# Altium footprint library 15EDGVC_VH.PcbLib: 46 footprints (part 2 of 3)
Each footprint in its own frame and in the unit in brackets; x right, y up, seen from the top. Pads: shape width x height; smd on the part's side, far side on the other; paste and mask are expansions set on the pad; w line width, h text height; cw(c..) or ccw(c..) is an arc to the next point about the centre after c.
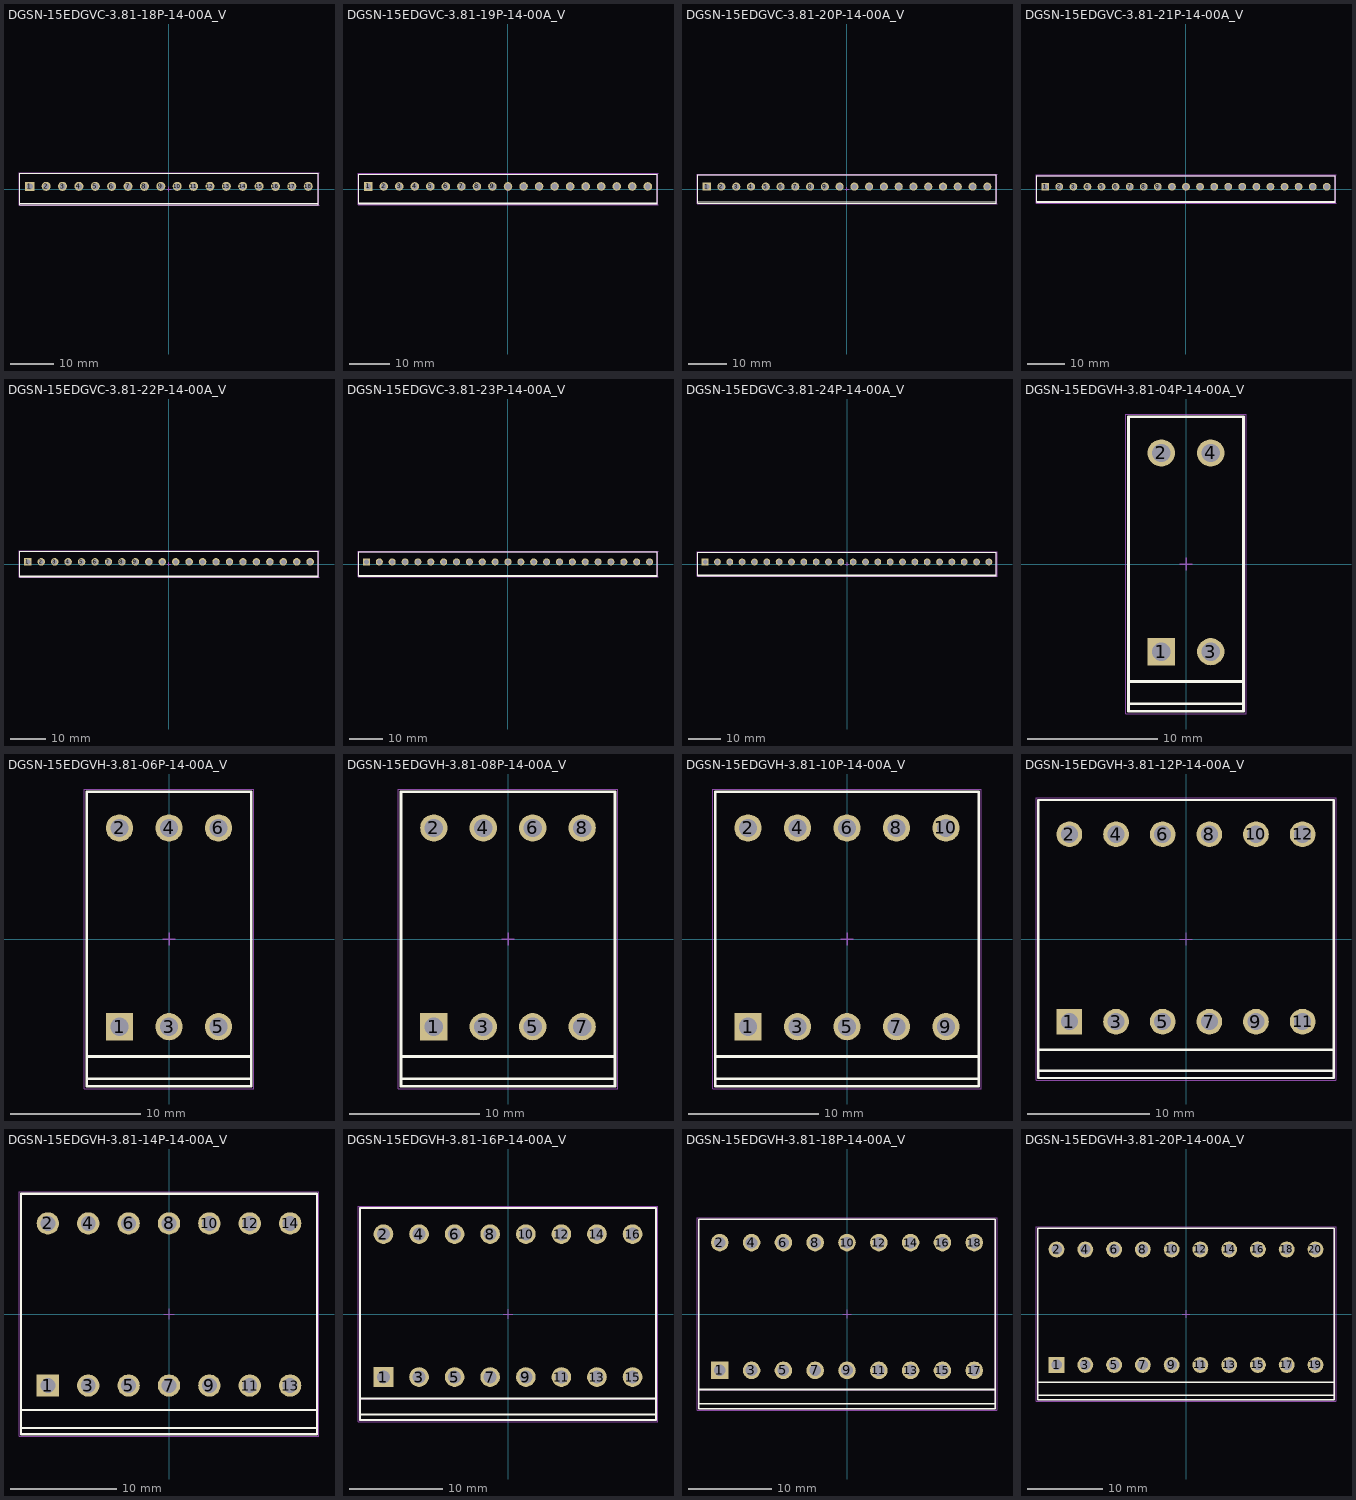
[diagram p1: the footprints below, top view; thin cyan lines are the x and y axes]

## DGSN-15EDGVC-3.81-18P-14-00A_V [mm] "Terminal Block, 18-Pin, Body 69.37x7.24mm, Pitch 3.81mm"
height 9.2
pads (18):
  rect 2.1x2.1 hole 1.4: 1(-32.385,0.62)
  round 2.1 hole 1.4: 2(-28.575,0.62) 3(-24.765,0.62) 4(-20.955,0.62) 5(-17.145,0.62) 6(-13.335,0.62) 7(-9.525,0.62) 8(-5.715,0.62) 9(-1.905,0.62) 10(1.905,0.62) 11(5.715,0.62) 12(9.525,0.62) 13(13.335,0.62) 14(17.145,0.62) 15(20.955,0.62) 16(24.765,0.62) 17(28.575,0.62) 18(32.385,0.62)
Top Overlay:
  lines w0.2: -34.685,-3.35 34.685,-3.35 ; -34.685,-3.62 34.685,-3.62 34.685,3.62 -34.685,3.62 -34.685,-3.62
Mechanical 13:
  lines w0.1: -34.685,-3.62 34.685,-3.62 34.685,3.62 -34.685,3.62 -34.685,-3.62
Mechanical 15:
  lines w0.05: -34.885,-3.82 -34.885,3.82 ; -34.885,-3.82 34.885,-3.82 34.885,3.82 -34.885,3.82
  lines w0.1: -0.5,0 0.5,0 ; 0,-0.5 0,0.5
3D body "15EDGVC-3.81-18P-14-00AH.STEP": height 9.2, standoff -3.4, extent -34.685,-3.58 34.685,3.62

## DGSN-15EDGVC-3.81-19P-14-00A_V [mm] "Terminal Block, 19-Pin, Body 73.18x7.24mm, Pitch 3.81mm"
height 9.2
pads (19):
  rect 2.1x2.1 hole 1.4: 1(-34.29,0.62)
  round 2.1 hole 1.4: 2(-30.48,0.62) 3(-26.67,0.62) 4(-22.86,0.62) 5(-19.05,0.62) 6(-15.24,0.62) 7(-11.43,0.62) 8(-7.62,0.62) 9(-3.81,0.62) 10(0,0.62) 11(3.81,0.62) 12(7.62,0.62) 13(11.43,0.62) 14(15.24,0.62) 15(19.05,0.62) 16(22.86,0.62) 17(26.67,0.62) 18(30.48,0.62) 19(34.29,0.62)
Top Overlay:
  lines w0.2: -36.59,-3.35 36.59,-3.35 ; -36.59,-3.62 36.59,-3.62 36.59,3.62 -36.59,3.62 -36.59,-3.62
Mechanical 13:
  lines w0.1: -36.59,-3.62 36.59,-3.62 36.59,3.62 -36.59,3.62 -36.59,-3.62
Mechanical 15:
  lines w0.05: -36.79,-3.82 -36.79,3.82 ; -36.79,-3.82 36.79,-3.82 36.79,3.82 -36.79,3.82
  lines w0.1: -0.5,0 0.5,0 ; 0,-0.5 0,0.5
3D body "15EDGVC-3.81-19P-14-00AH.STEP": height 9.2, standoff -3.4, extent -36.59,-3.58 36.59,3.62

## DGSN-15EDGVC-3.81-20P-14-00A_V [mm] "Terminal Block, 20-Pin, Body 76.99x7.24mm, Pitch 3.81mm"
height 9.2
pads (20):
  rect 2.1x2.1 hole 1.4: 1(-36.195,0.62)
  round 2.1 hole 1.4: 2(-32.385,0.62) 3(-28.575,0.62) 4(-24.765,0.62) 5(-20.955,0.62) 6(-17.145,0.62) 7(-13.335,0.62) 8(-9.525,0.62) 9(-5.715,0.62) 10(-1.905,0.62) 11(1.905,0.62) 12(5.715,0.62) 13(9.525,0.62) 14(13.335,0.62) 15(17.145,0.62) 16(20.955,0.62) 17(24.765,0.62) 18(28.575,0.62) 19(32.385,0.62) 20(36.195,0.62)
Top Overlay:
  lines w0.2: -38.495,-3.35 38.495,-3.35 ; -38.495,-3.62 38.495,-3.62 38.495,3.62 -38.495,3.62 -38.495,-3.62
Mechanical 13:
  lines w0.1: -38.495,-3.62 38.495,-3.62 38.495,3.62 -38.495,3.62 -38.495,-3.62
Mechanical 15:
  lines w0.05: -38.695,-3.82 -38.695,3.82 ; -38.695,-3.82 38.695,-3.82 38.695,3.82 -38.695,3.82
  lines w0.1: -0.5,0 0.5,0 ; 0,-0.5 0,0.5
3D body "15EDGVC-3.81-20P-14-00AH.STEP": height 9.2, standoff -3.4, extent -38.495,-3.58 38.495,3.62

## DGSN-15EDGVC-3.81-21P-14-00A_V [mm] "Terminal Block, 21-Pin, Body 80.80x7.24mm, Pitch 3.81mm"
height 9.2
pads (21):
  rect 2.1x2.1 hole 1.4: 1(-38.1,0.62)
  round 2.1 hole 1.4: 2(-34.29,0.62) 3(-30.48,0.62) 4(-26.67,0.62) 5(-22.86,0.62) 6(-19.05,0.62) 7(-15.24,0.62) 8(-11.43,0.62) 9(-7.62,0.62) 10(-3.81,0.62) 11(0,0.62) 12(3.81,0.62) 13(7.62,0.62) 14(11.43,0.62) 15(15.24,0.62) 16(19.05,0.62) 17(22.86,0.62) 18(26.67,0.62) 19(30.48,0.62) 20(34.29,0.62) 21(38.1,0.62)
Top Overlay:
  lines w0.2: -40.4,-3.35 40.4,-3.35 ; -40.4,-3.62 40.4,-3.62 40.4,3.62 -40.4,3.62 -40.4,-3.62
Mechanical 13:
  lines w0.1: -40.4,-3.62 40.4,-3.62 40.4,3.62 -40.4,3.62 -40.4,-3.62
Mechanical 15:
  lines w0.05: -40.6,-3.82 -40.6,3.82 ; -40.6,-3.82 40.6,-3.82 40.6,3.82 -40.6,3.82
  lines w0.1: -0.5,0 0.5,0 ; 0,-0.5 0,0.5
3D body "15EDGVC-3.81-21P-14-00AH.STEP": height 9.2, standoff -3.4, extent -40.4,-3.58 40.4,3.62

## DGSN-15EDGVC-3.81-22P-14-00A_V [mm] "Terminal Block, 22-Pin, Body 84.61x7.24mm, Pitch 3.81mm"
height 9.2
pads (22):
  rect 2.1x2.1 hole 1.4: 1(-40.005,0.62)
  round 2.1 hole 1.4: 2(-36.195,0.62) 3(-32.385,0.62) 4(-28.575,0.62) 5(-24.765,0.62) 6(-20.955,0.62) 7(-17.145,0.62) 8(-13.335,0.62) 9(-9.525,0.62) 10(-5.715,0.62) 11(-1.905,0.62) 12(1.905,0.62) 13(5.715,0.62) 14(9.525,0.62) 15(13.335,0.62) 16(17.145,0.62) 17(20.955,0.62) 18(24.765,0.62) 19(28.575,0.62) 20(32.385,0.62) 21(36.195,0.62) 22(40.005,0.62)
Top Overlay:
  lines w0.2: -42.305,-3.35 42.305,-3.35 ; -42.305,-3.62 -42.305,3.62 42.305,3.62 42.305,-3.62 -42.305,-3.62
Mechanical 13:
  lines w0.1: -42.305,-3.62 -42.305,3.62 42.305,3.62 42.305,-3.62 -42.305,-3.62
Mechanical 15:
  lines w0.05: -42.505,-3.82 -42.505,3.82 ; -42.505,-3.82 42.505,-3.82 42.505,3.82 -42.505,3.82
  lines w0.1: -0.5,0 0.5,0 ; 0,-0.5 0,0.5
3D body "15EDGVC-3.81-22P-14-00AH.STEP": height 9.2, standoff -3.4, extent -42.305,-3.58 42.305,3.62

## DGSN-15EDGVC-3.81-23P-14-00A_V [mm] "Terminal Block, 23-Pin, Body 88.42x7.24mm, Pitch 3.81mm"
height 9.2
pads (23):
  rect 2.1x2.1 hole 1.4: 1(-41.91,0.62)
  round 2.1 hole 1.4: 2(-38.1,0.62) 3(-34.29,0.62) 4(-30.48,0.62) 5(-26.67,0.62) 6(-22.86,0.62) 7(-19.05,0.62) 8(-15.24,0.62) 9(-11.43,0.62) 10(-7.62,0.62) 11(-3.81,0.62) 12(0,0.62) 13(3.81,0.62) 14(7.62,0.62) 15(11.43,0.62) 16(15.24,0.62) 17(19.05,0.62) 18(22.86,0.62) 19(26.67,0.62) 20(30.48,0.62) 21(34.29,0.62) 22(38.1,0.62) 23(41.91,0.62)
Top Overlay:
  lines w0.2: -44.21,-3.35 44.21,-3.35 ; -44.21,-3.62 44.21,-3.62 44.21,3.62 -44.21,3.62 -44.21,-3.62
Mechanical 13:
  lines w0.1: -44.21,-3.62 44.21,-3.62 44.21,3.62 -44.21,3.62 -44.21,-3.62
Mechanical 15:
  lines w0.05: -44.41,-3.82 -44.41,3.82 ; -44.41,-3.82 44.41,-3.82 44.41,3.82 -44.41,3.82
  lines w0.1: -0.5,0 0.5,0 ; 0,-0.5 0,0.5
3D body "15EDGVC-3.81-23P-14-00AH.STEP": height 9.2, standoff -3.4, extent -44.21,-3.58 44.21,3.62

## DGSN-15EDGVC-3.81-24P-14-00A_V [mm] "Terminal Block, 24-Pin, Body 92.23x7.24mm, Pitch 3.81mm"
height 9.2
pads (24):
  rect 2.1x2.1 hole 1.4: 1(-43.815,0.62)
  round 2.1 hole 1.4: 2(-40.005,0.62) 3(-36.195,0.62) 4(-32.385,0.62) 5(-28.575,0.62) 6(-24.765,0.62) 7(-20.955,0.62) 8(-17.145,0.62) 9(-13.335,0.62) 10(-9.525,0.62) 11(-5.715,0.62) 12(-1.905,0.62) 13(1.905,0.62) 14(5.715,0.62) 15(9.525,0.62) 16(13.335,0.62) 17(17.145,0.62) 18(20.955,0.62) 19(24.765,0.62) 20(28.575,0.62) 21(32.385,0.62) 22(36.195,0.62) 23(40.005,0.62) 24(43.815,0.62)
Top Overlay:
  lines w0.2: -46.115,-3.35 46.115,-3.35 ; -46.115,-3.62 -46.115,3.62 46.115,3.62 46.115,-3.62 -46.115,-3.62
Mechanical 13:
  lines w0.1: -46.115,-3.62 -46.115,3.62 46.115,3.62 46.115,-3.62 -46.115,-3.62
Mechanical 15:
  lines w0.05: -46.315,-3.82 -46.315,3.82 ; -46.315,-3.82 46.315,-3.82 46.315,3.82 -46.315,3.82
  lines w0.1: -0.5,0 0.5,0 ; 0,-0.5 0,0.5
3D body "15EDGVC-3.81-24P-14-00AH.STEP": height 9.2, standoff -3.4, extent -46.115,-3.58 46.115,3.62

## DGSN-15EDGVH-3.81-04P-14-00A_V [mm] "Terminal Block, 4-Pin, Body 8.86x22.70mm, Pitch 3.81mm"
height 21.8
pads (4):
  rect 2.1x2.1 hole 1.4: 1(-1.905,-6.75)
  round 2.1 hole 1.4: 2(-1.905,8.55) 3(1.905,-6.75) 4(1.905,8.55)
Top Overlay:
  lines w0.2: -4.43,-10.75 4.43,-10.75 ; -4.43,-9.05 4.43,-9.05 ; -4.43,-11.35 4.43,-11.35 4.43,11.35 -4.43,11.35 -4.43,-11.35
Mechanical 13:
  lines w0.1: -4.43,-9.05 4.43,-9.05 ; -4.43,-11.35 4.43,-11.35 4.43,11.35 -4.43,11.35 -4.43,-11.35
Mechanical 15:
  lines w0.05: -4.63,-11.55 4.63,-11.55 4.63,11.55 -4.63,11.55 -4.63,-11.55
  lines w0.1: -0.5,0 0.5,0 ; 0,-0.5 0,0.5
3D body "15EDGVH-3.81-04P-14-00AH.STEP": height 21.8, standoff -3.4, extent -4.43,-11.35 4.42,11.35

## DGSN-15EDGVH-3.81-06P-14-00A_V [mm] "Terminal Block, 6-Pin, Body 12.67x22.70mm, Pitch 3.81mm"
height 21.8
pads (6):
  rect 2.1x2.1 hole 1.4: 1(-3.81,-6.75)
  round 2.1 hole 1.4: 2(-3.81,8.55) 3(0,-6.75) 4(0,8.55) 5(3.81,-6.75) 6(3.81,8.55)
Top Overlay:
  lines w0.2: -6.335,-10.75 6.335,-10.75 ; -6.335,-9.05 6.335,-9.05 ; -6.335,-11.35 -6.335,11.35 6.335,11.35 6.335,-11.35 -6.335,-11.35
Mechanical 13:
  lines w0.1: -6.335,-9.05 6.335,-9.05 ; -6.335,-11.35 -6.335,11.35 6.335,11.35 6.335,-11.35 -6.335,-11.35
Mechanical 15:
  lines w0.05: -6.535,-11.55 -6.535,11.55 6.535,11.55 6.535,-11.55 -6.535,-11.55
  lines w0.1: -0.5,0 0.5,0 ; 0,-0.5 0,0.5
3D body "15EDGVH-3.81-06P-14-00AH.STEP": height 21.8, standoff -3.4, extent -6.335,-11.35 6.325,11.35

## DGSN-15EDGVH-3.81-08P-14-00A_V [mm] "Terminal Block, 8-Pin, Body 16.48x22.70mm, Pitch 3.81mm"
height 21.8
pads (8):
  rect 2.1x2.1 hole 1.4: 1(-5.715,-6.75)
  round 2.1 hole 1.4: 2(-5.715,8.55) 3(-1.905,-6.75) 4(-1.905,8.55) 5(1.905,-6.75) 6(1.905,8.55) 7(5.715,-6.75) 8(5.715,8.55)
Top Overlay:
  lines w0.2: -8.24,-10.75 8.24,-10.75 ; -8.24,-9.05 8.24,-9.05 ; -8.24,-11.35 8.24,-11.35 8.24,11.35 -8.24,11.35 -8.24,-11.35
Mechanical 13:
  lines w0.1: -8.24,-9.05 8.24,-9.05 ; -8.24,-11.35 8.24,-11.35 8.24,11.35 -8.24,11.35 -8.24,-11.35
Mechanical 15:
  lines w0.05: -8.44,-11.55 8.44,-11.55 8.44,11.55 -8.44,11.55 -8.44,-11.55
  lines w0.1: -0.5,0 0.5,0 ; 0,-0.5 0,0.5
3D body "15EDGVH-3.81-08P-14-00AH.STEP": height 21.8, standoff -3.4, extent -8.24,-11.35 8.23,11.35

## DGSN-15EDGVH-3.81-10P-14-00A_V [mm] "Terminal Block, 10-Pin, Body 20.29x22.70mm, Pitch 3.81mm"
height 21.8
pads (10):
  rect 2.1x2.1 hole 1.4: 1(-7.62,-6.75)
  round 2.1 hole 1.4: 2(-7.62,8.55) 3(-3.81,-6.75) 4(-3.81,8.55) 5(0,-6.75) 6(0,8.55) 7(3.81,-6.75) 8(3.81,8.55) 9(7.62,-6.75) 10(7.62,8.55)
Top Overlay:
  lines w0.2: -10.145,-10.75 10.145,-10.75 ; -10.145,-9.05 10.145,-9.05 ; -10.145,-11.35 10.145,-11.35 10.145,11.35 -10.145,11.35 -10.145,-11.35
Mechanical 13:
  lines w0.1: -10.145,-9.05 10.145,-9.05 ; -10.145,-11.35 10.145,-11.35 10.145,11.35 -10.145,11.35 -10.145,-11.35
Mechanical 15:
  lines w0.05: -10.345,-11.55 10.345,-11.55 10.345,11.55 -10.345,11.55 -10.345,-11.55
  lines w0.1: -0.5,0 0.5,0 ; 0,-0.5 0,0.5
3D body "15EDGVH-3.81-10P-14-00AH.STEP": height 21.8, standoff -3.4, extent -10.145,-11.35 10.135,11.35

## DGSN-15EDGVH-3.81-12P-14-00A_V [mm] "Terminal Block, 12-Pin, Body 24.10x22.70mm, Pitch 3.81mm"
height 21.8
pads (12):
  rect 2.1x2.1 hole 1.4: 1(-9.525,-6.75)
  round 2.1 hole 1.4: 2(-9.525,8.55) 3(-5.715,-6.75) 4(-5.715,8.55) 5(-1.905,-6.75) 6(-1.905,8.55) 7(1.905,-6.75) 8(1.905,8.55) 9(5.715,-6.75) 10(5.715,8.55) 11(9.525,-6.75) 12(9.525,8.55)
Top Overlay:
  lines w0.2: -12.05,-10.75 12.05,-10.75 ; -12.05,-9.05 12.05,-9.05 ; -12.05,-11.35 12.05,-11.35 12.05,11.35 -12.05,11.35 -12.05,-11.35
Mechanical 13:
  lines w0.1: -12.05,-9.05 12.05,-9.05 ; -12.05,-11.35 12.05,-11.35 12.05,11.35 -12.05,11.35 -12.05,-11.35
Mechanical 15:
  lines w0.05: -12.25,-11.55 12.25,-11.55 12.25,11.55 -12.25,11.55 -12.25,-11.55
  lines w0.1: -0.5,0 0.5,0 ; 0,-0.5 0,0.5
3D body "15EDGVH-3.81-12P-14-00AH.STEP": height 21.8, standoff -3.4, extent -12.05,-11.35 12.04,11.35

## DGSN-15EDGVH-3.81-14P-14-00A_V [mm] "Terminal Block, 14-Pin, Body 27.91x22.70mm, Pitch 3.81mm"
height 21.8
pads (14):
  rect 2.1x2.1 hole 1.4: 1(-11.43,-6.75)
  round 2.1 hole 1.4: 2(-11.43,8.55) 3(-7.62,-6.75) 4(-7.62,8.55) 5(-3.81,-6.75) 6(-3.81,8.55) 7(0,-6.75) 8(0,8.55) 9(3.81,-6.75) 10(3.81,8.55) 11(7.62,-6.75) 12(7.62,8.55) 13(11.43,-6.75) 14(11.43,8.55)
Top Overlay:
  lines w0.2: -13.955,-10.75 13.955,-10.75 ; -13.955,-9.05 13.955,-9.05 ; -13.955,-11.35 13.955,-11.35 13.955,11.35 -13.955,11.35 -13.955,-11.35
Mechanical 13:
  lines w0.1: -13.955,-9.05 13.955,-9.05 ; -13.955,-11.35 13.955,-11.35 13.955,11.35 -13.955,11.35 -13.955,-11.35
Mechanical 15:
  lines w0.05: -14.155,-11.55 14.155,-11.55 14.155,11.55 -14.155,11.55 -14.155,-11.55
  lines w0.1: -0.5,0 0.5,0 ; 0,-0.5 0,0.5
3D body "15EDGVH-3.81-14P-14-00AH.STEP": height 21.8, standoff -3.4, extent -13.955,-11.35 13.945,11.35

## DGSN-15EDGVH-3.81-16P-14-00A_V [mm] "Terminal Block, 16-Pin, Body 31.72x22.70mm, Pitch 3.81mm"
height 21.8
pads (16):
  rect 2.1x2.1 hole 1.4: 1(-13.335,-6.75)
  round 2.1 hole 1.4: 2(-13.335,8.55) 3(-9.525,-6.75) 4(-9.525,8.55) 5(-5.715,-6.75) 6(-5.715,8.55) 7(-1.905,-6.75) 8(-1.905,8.55) 9(1.905,-6.75) 10(1.905,8.55) 11(5.715,-6.75) 12(5.715,8.55) 13(9.525,-6.75) 14(9.525,8.55) 15(13.335,-6.75) 16(13.335,8.55)
Top Overlay:
  lines w0.2: -15.86,-10.75 15.86,-10.75 ; -15.86,-9.05 15.86,-9.05 ; -15.86,-11.35 15.86,-11.35 15.86,11.35 -15.86,11.35 -15.86,-11.35
Mechanical 13:
  lines w0.1: -15.86,-9.05 15.86,-9.05 ; -15.86,-11.35 15.86,-11.35 15.86,11.35 -15.86,11.35 -15.86,-11.35
Mechanical 15:
  lines w0.05: -16.06,-11.55 16.06,-11.55 16.06,11.55 -16.06,11.55 -16.06,-11.55
  lines w0.1: -0.5,0 0.5,0 ; 0,-0.5 0,0.5
3D body "15EDGVH-3.81-16P-14-00AH.STEP": height 21.8, standoff -3.4, extent -15.86,-11.35 15.85,11.35

## DGSN-15EDGVH-3.81-18P-14-00A_V [mm] "Terminal Block, 18-Pin, Body 35.53x22.70mm, Pitch 3.81mm"
height 21.8
pads (18):
  rect 2.1x2.1 hole 1.4: 1(-15.24,-6.75)
  round 2.1 hole 1.4: 2(-15.24,8.55) 3(-11.43,-6.75) 4(-11.43,8.55) 5(-7.62,-6.75) 6(-7.62,8.55) 7(-3.81,-6.75) 8(-3.81,8.55) 9(0,-6.75) 10(0,8.55) 11(3.81,-6.75) 12(3.81,8.55) 13(7.62,-6.75) 14(7.62,8.55) 15(11.43,-6.75) 16(11.43,8.55) 17(15.24,-6.75) 18(15.24,8.55)
Top Overlay:
  lines w0.2: -17.765,-10.75 17.765,-10.75 ; -17.765,-9.05 17.765,-9.05 ; -17.765,-11.35 17.765,-11.35 17.765,11.35 -17.765,11.35 -17.765,-11.35
Mechanical 13:
  lines w0.1: -17.765,-9.05 17.765,-9.05 ; -17.765,-11.35 17.765,-11.35 17.765,11.35 -17.765,11.35 -17.765,-11.35
Mechanical 15:
  lines w0.05: -17.965,-11.55 17.965,-11.55 17.965,11.55 -17.965,11.55 -17.965,-11.55
  lines w0.1: -0.5,0 0.5,0 ; 0,-0.5 0,0.5
3D body "15EDGVH-3.81-18P-14-00AH.STEP": height 21.8, standoff -3.4, extent -17.765,-11.35 17.755,11.35

## DGSN-15EDGVH-3.81-20P-14-00A_V [mm] "Terminal Block, 20-Pin, Body 39.34x22.70mm, Pitch 3.81mm"
height 21.8
pads (20):
  rect 2.1x2.1 hole 1.4: 1(-17.145,-6.75)
  round 2.1 hole 1.4: 2(-17.145,8.55) 3(-13.335,-6.75) 4(-13.335,8.55) 5(-9.525,-6.75) 6(-9.525,8.55) 7(-5.715,-6.75) 8(-5.715,8.55) 9(-1.905,-6.75) 10(-1.905,8.55) 11(1.905,-6.75) 12(1.905,8.55) 13(5.715,-6.75) 14(5.715,8.55) 15(9.525,-6.75) 16(9.525,8.55) 17(13.335,-6.75) 18(13.335,8.55) 19(17.145,-6.75) 20(17.145,8.55)
Top Overlay:
  lines w0.2: -19.67,-10.75 19.67,-10.75 ; -19.67,-9.05 19.67,-9.05 ; -19.67,-11.35 19.67,-11.35 19.67,11.35 -19.67,11.35 -19.67,-11.35
Mechanical 13:
  lines w0.1: -19.67,-9.05 19.67,-9.05 ; -19.67,-11.35 19.67,-11.35 19.67,11.35 -19.67,11.35 -19.67,-11.35
Mechanical 15:
  lines w0.05: -19.87,-11.55 19.87,-11.55 19.87,11.55 -19.87,11.55 -19.87,-11.55
  lines w0.1: -0.5,0 0.5,0 ; 0,-0.5 0,0.5
3D body "15EDGVH-3.81-20P-14-00AH.STEP": height 21.8, standoff -3.4, extent -19.67,-11.35 19.66,11.35